# Altium schematic symbol library LATTICEPLDS_Library.SchLib: 291 symbols (part 3 of 32)
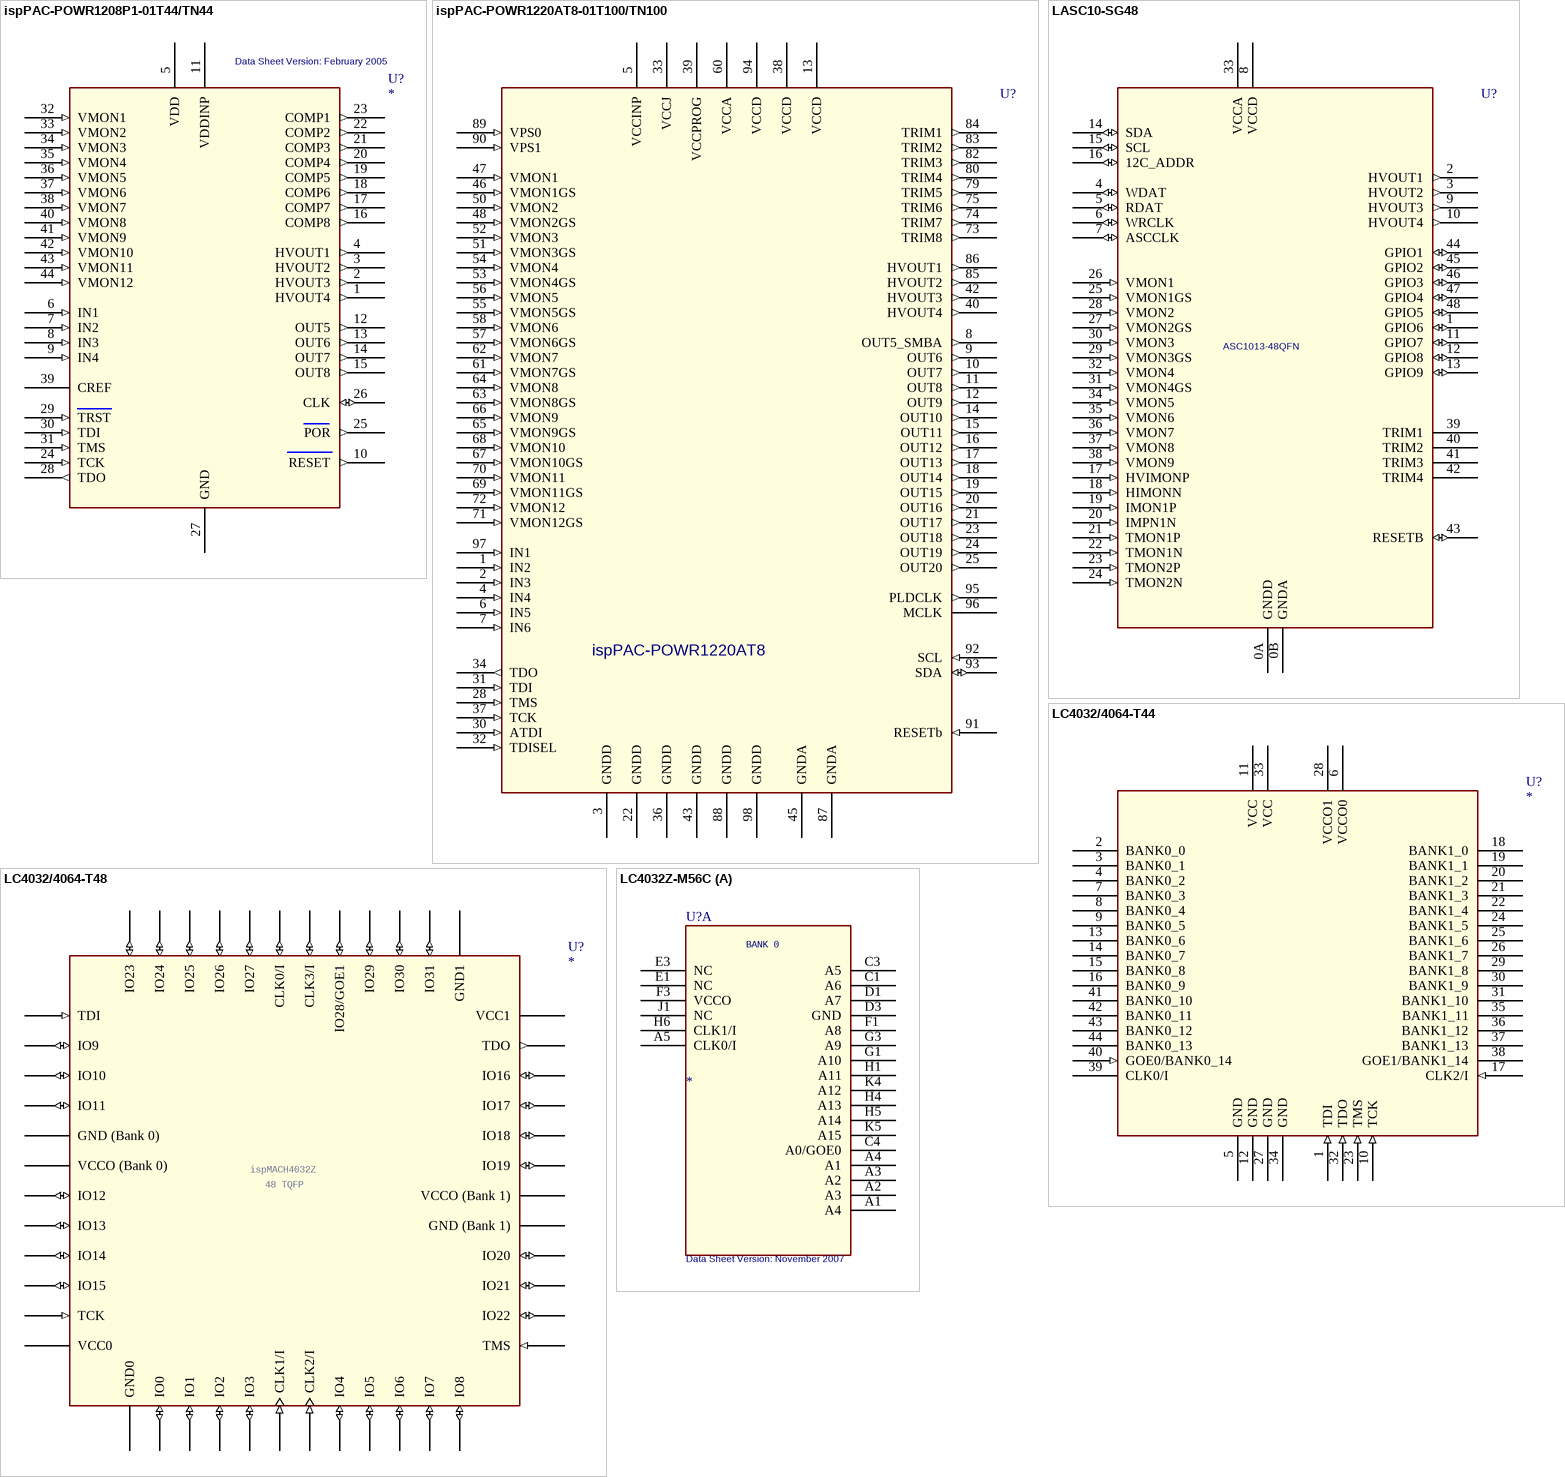
[diagram p305: symbols ispPAC-POWR1208P1-01T44/TN44 to LC4032Z-M56C]

## LASC10-SG48
designator U?, comment ASC1013-48QFN
pins: 0A GNDD (power), 0B GNDA (power), 1 GPIO6 (io), 2 HVOUT1 (out), 3 HVOUT2 (out), 4 WDAT (io), 5 RDAT (io), 6 WRCLK (io), 7 ASCCLK (io), 8 VCCD (power), 9 HVOUT3 (out), 10 HVOUT4 (out), 11 GPIO7 (io), 12 GPIO8 (io), 13 GPIO9 (io), 14 SDA (io), 15 SCL (io), 16 12C_ADDR (io), 17 HVIMONP (in), 18 HIMONN (in), 19 IMON1P (in), 20 IMPN1N (in), 21 TMON1P (in), 22 TMON1N (in), 23 TMON2P (in), 24 TMON2N (in), 25 VMON1GS (in), 26 VMON1 (in), 27 VMON2GS (in), 28 VMON2 (in), 29 VMON3GS (in), 30 VMON3 (in), 31 VMON4GS (in), 32 VMON4 (in), 33 VCCA (power), 34 VMON5 (in), 35 VMON6 (in), 36 VMON7 (in), 37 VMON8 (in), 38 VMON9 (in), 39 TRIM1, 40 TRIM2, 41 TRIM3, 42 TRIM4, 43 RESETB (io), 44 GPIO1 (io), 45 GPIO2 (io), 46 GPIO3 (io), 47 GPIO4 (io), 48 GPIO5 (io)

## LC4032/4064-T44
designator U?
pins: 1 TDI (in), 2 BANK0_0 (hiz), 3 BANK0_1 (hiz), 4 BANK0_2 (hiz), 5 GND (power), 6 VCCO0 (power), 7 BANK0_3 (hiz), 8 BANK0_4 (hiz), 9 BANK0_5 (hiz), 10 TCK (in), 11 VCC (power), 12 GND (power), 13 BANK0_6 (hiz), 14 BANK0_7 (hiz), 15 BANK0_8 (hiz), 16 BANK0_9 (hiz), 17 CLK2/I (in), 18 BANK1_0 (hiz), 19 BANK1_1 (hiz), 20 BANK1_2 (hiz), 21 BANK1_3 (hiz), 22 BANK1_4 (hiz), 23 TMS (in), 24 BANK1_5 (hiz), 25 BANK1_6 (hiz), 26 BANK1_7 (hiz), 27 GND (power), 28 VCCO1 (power), 29 BANK1_8 (hiz), 30 BANK1_9 (hiz), 31 BANK1_10 (hiz), 32 TDO (in), 33 VCC (power), 34 GND (power), 35 BANK1_11 (hiz), 36 BANK1_12 (hiz), 37 BANK1_13 (hiz), 38 GOE1/BANK1_14 (hiz), 39 CLK0/I (power), 40 GOE0/BANK0_14 (in), 41 BANK0_10 (hiz), 42 BANK0_11 (hiz), 43 BANK0_12 (hiz), 44 BANK0_13 (hiz)

## LC4032/4064-T48
designator U?
pins: CLK0/I (io), CLK1/I (in), CLK2/I (in), CLK3/I (io), GND0 (power), GND1 (power), GND (Bank 0) (power), GND (Bank 1) (power), IO0 (io), IO1 (io), IO2 (io), IO3 (io), IO4 (io), IO5 (io), IO6 (io), IO7 (io), IO8 (io), IO9 (io), IO10 (io), IO11 (io), IO12 (io), IO13 (io), IO14 (io), IO15 (io), IO16 (io), IO17 (io), IO18 (io), IO19 (io), IO20 (io), IO21 (io), IO22 (io), IO23 (io), IO24 (io), IO25 (io), IO26 (io), IO27 (io), IO28/GOE1 (io), IO29 (io), IO30 (io), IO31 (io), TCK (in), TDI (in), TDO (out), TMS (in), VCC0 (power), VCC1 (power), VCCO (Bank 0) (power), VCCO (Bank 1) (power)
text: ispMACH4032Z; 48 TQFP

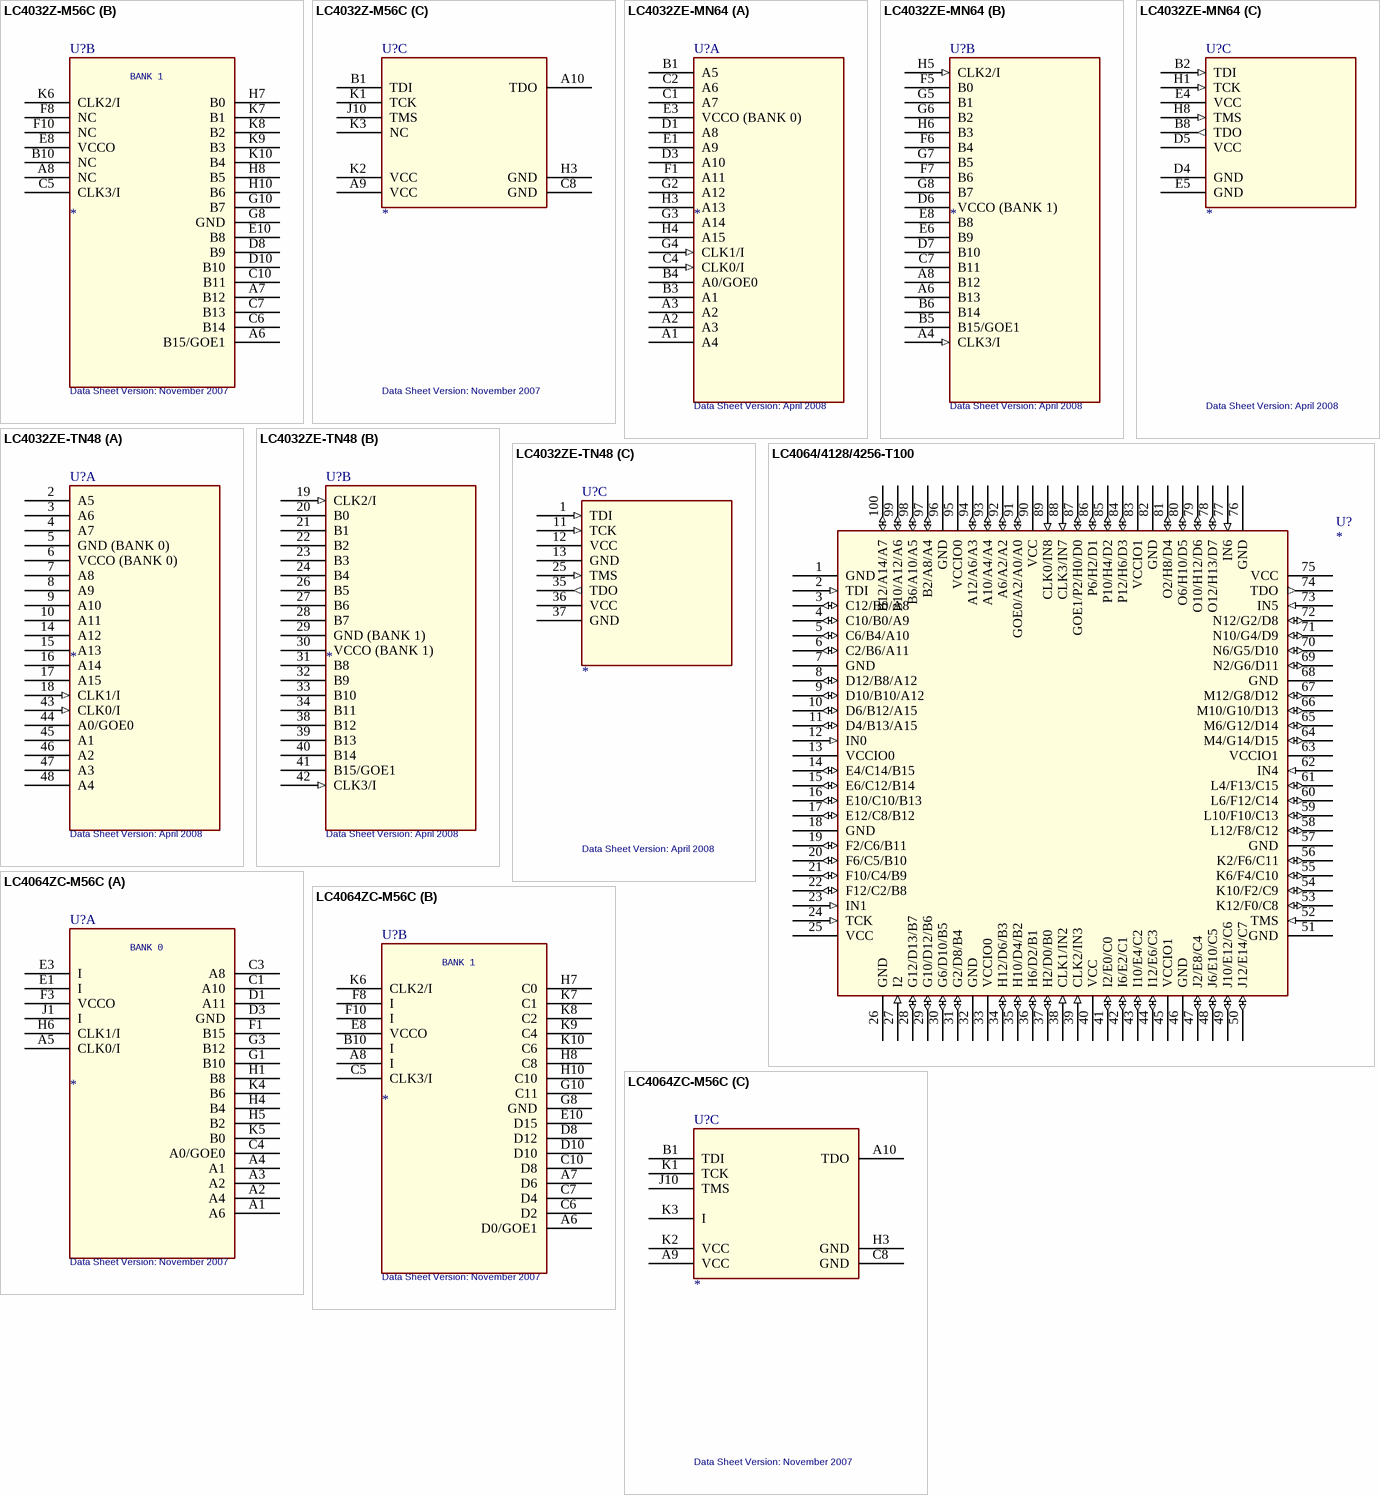
[diagram p23: symbols LC4032Z-M56C to LC4064ZC-M56C]

## LC4032Z-M56C
designator U?  Data Sheet Version: November 2007
SPLIT_INST: TRUE; SWAP_INFO: (S1+S2+S3)
part A pins: A1 A4, A2 A3, A3 A2, A4 A1, A5 CLK0/I, C1 A6 (power), C3 A5 (power), C4 A0/GOE0, D1 A7 (power), D3 GND (power), E1 NC (power), E3 NC (power), F1 A8 (power), F3 VCCO (power), G1 A10, G3 A9 (power), H1 A11, H4 A13, H5 A14, H6 CLK1/I, J1 NC, K4 A12, K5 A15
part B pins: A6 B15/GOE1, A7 B12, A8 NC, B10 NC, C5 CLK3/I, C6 B14, C7 B13, C10 B11, D8 B9, D10 B10, E8 VCCO, E10 B8, F8 NC, F10 NC, G8 GND, G10 B7, H7 B0, H8 B5, H10 B6, K6 CLK2/I, K7 B1, K8 B2, K9 B3, K10 B4
part C pins: A9 VCC, A10 TDO, B1 TDI (power), C8 GND, H3 GND, J10 TMS, K1 TCK, K2 VCC, K3 NC
part A text: BANK 0
part B text: BANK 1

## LC4032ZE-MN64
designator U?  Data Sheet Version: April 2008
SWAP_INFO: (S1+S2+S3); SPLIT_INST: TRUE
part A pins: A1 A4, A2 A3, A3 A2, B1 A5, B3 A1, B4 A0/GOE0, C1 A7, C2 A6, C4 CLK0/I (in), D1 A8, D3 A10, E1 A9, E3 VCCO (BANK 0) (power), F1 A11, G2 A12, G3 A14, G4 CLK1/I (in), H3 A13, H4 A15
part B pins: A4 CLK3/I (in), A6 B13, A8 B12, B5 B15/GOE1, B6 B14, C7 B11, D6 VCCO (BANK 1) (power), D7 B10, E6 B9, E8 B8, F5 B0, F6 B4, F7 B6, G5 B1, G6 B2, G7 B5, G8 B7, H5 CLK2/I (in), H6 B3
part C pins: B2 TDI (in), B8 TDO (out), D4 GND, D5 VCC (power), E4 VCC (power), E5 GND, H1 TCK (in), H8 TMS (in)

## LC4032ZE-TN48
designator U?  Data Sheet Version: April 2008
SWAP_INFO: (S1+S2+S3); SPLIT_INST: TRUE
part A pins: 2 A5, 3 A6, 4 A7, 5 GND (BANK 0) (power), 6 VCCO (BANK 0) (power), 7 A8, 8 A9, 9 A10, 10 A11, 14 A12, 15 A13, 16 A14, 17 A15, 18 CLK1/I (in), 43 CLK0/I (in), 44 A0/GOE0, 45 A1, 46 A2, 47 A3, 48 A4
part B pins: 19 CLK2/I (in), 20 B0, 21 B1, 22 B2, 23 B3, 24 B4, 26 B5, 27 B6, 28 B7, 29 GND (BANK 1) (power), 30 VCCO (BANK 1) (power), 31 B8, 32 B9, 33 B10, 34 B11, 38 B12, 39 B13, 40 B14, 41 B15/GOE1, 42 CLK3/I (in)
part C pins: 1 TDI (in), 11 TCK (in), 12 VCC (power), 13 GND (power), 25 TMS (in), 35 TDO (out), 36 VCC (power), 37 GND (power)

## LC4064/4128/4256-T100
designator U?
footprint TQFP-100
pins: 1 GND (power), 2 TDI (in), 3 C12/B0/A8 (io), 4 C10/B0/A9 (io), 5 C6/B4/A10 (io), 6 C2/B6/A11 (io), 7 GND (power), 8 D12/B8/A12 (io), 9 D10/B10/A12 (io), 10 D6/B12/A15 (io), 11 D4/B13/A15 (io), 12 IN0 (in), 13 VCCIO0 (power), 14 E4/C14/B15 (io), 15 E6/C12/B14 (io), 16 E10/C10/B13 (io), 17 E12/C8/B12 (io), 18 GND (power), 19 F2/C6/B11 (io), 20 F6/C5/B10 (io), 21 F10/C4/B9 (io), 22 F12/C2/B8 (io), 23 IN1 (in), 24 TCK (in), 25 VCC (power), 26 GND (power), 27 I2 (in), 28 G12/D13/B7 (io), 29 G10/D12/B6 (io), 30 G6/D10/B5 (io), 31 G2/D8/B4 (io), 32 GND (power), 33 VCCIO0 (power), 34 H12/D6/B3 (io), 35 H10/D4/B2 (io), 36 H6/D2/B1 (io), 37 H2/D0/B0 (io), 38 CLK1/IN2 (in), 39 CLK2/IN3 (in), 40 VCC (power), 41 I2/E0/C0 (io), 42 I6/E2/C1 (io), 43 I10/E4/C2 (io), 44 I12/E6/C3 (io), 45 VCCIO1 (power), 46 GND (power), 47 J2/E8/C4 (io), 48 J6/E10/C5 (io), 49 J10/E12/C6 (io), 50 J12/E14/C7 (io), 51 GND (power), 52 TMS (in), 53 K12/F0/C8 (io), 54 K10/F2/C9 (io), 55 K6/F4/C10 (io), 56 K2/F6/C11 (io), 57 GND (power), 58 L12/F8/C12 (io), 59 L10/F10/C13 (io), 60 L6/F12/C14 (io), 61 L4/F13/C15 (io), 62 IN4 (in), 63 VCCIO1 (power), 64 M4/G14/D15 (io), 65 M6/G12/D14 (io), 66 M10/G10/D13 (io), 67 M12/G8/D12 (io), 68 GND (power), 69 N2/G6/D11 (io), 70 N6/G5/D10 (io), 71 N10/G4/D9 (io), 72 N12/G2/D8 (io), 73 IN5 (in), 74 TDO (out), 75 VCC (power), 76 GND (power), 77 IN6 (in), 78 O12/H13/D7 (io), 79 O10/H12/D6 (io), 80 O6/H10/D5 (io), 81 O2/H8/D4 (io), 82 GND (power), 83 VCCIO1 (power), 84 P12/H6/D3 (io), 85 P10/H4/D2 (io), 86 P6/H2/D1 (io), 87 GOE1/P2/H0/D0 (io), 88 CLK3/IN7 (in), 89 CLK0/IN8 (in), 90 VCC (power), 91 GOE0/A2/A0/A0 (io), 92 A6/A2/A2 (io), 93 A10/A4/A4 (io), 94 A12/A6/A3 (io), 95 VCCIO0 (power), 96 GND (power), 97 B2/A8/A4 (io), 98 B6/A10/A5 (io), 99 B10/A12/A6 (io), 100 B12/A14/A7 (io)

## LC4064ZC-M56C
designator U?  Data Sheet Version: November 2007
SWAP_INFO: (S1+S2+S3); SPLIT_INST: TRUE
part A pins: A1 A6, A2 A4, A3 A2, A4 A1, A5 CLK0/I, C1 A10 (power), C3 A8 (power), C4 A0/GOE0, D1 A11 (power), D3 GND (power), E1 I (power), E3 I (power), F1 B15 (power), F3 VCCO (power), G1 B10, G3 B12 (power), H1 B8, H4 B4, H5 B2, H6 CLK1/I, J1 I, K4 B6, K5 B0
part B pins: A6 D0/GOE1, A7 D6, A8 I, B10 I, C5 CLK3/I, C6 D2, C7 D4, C10 D8, D8 D12, D10, E8 VCCO, E10 D15, F8 I, F10 I, G8 GND, G10 C11, H7 C0, H8 C8, H10 C10, K6 CLK2/I, K7 C1, K8 C2, K9 C4, K10 C6
part C pins: A9 VCC, A10 TDO, B1 TDI (power), C8 GND, H3 GND, J10 TMS, K1 TCK, K2 VCC, K3 I
part A text: BANK 0
part B text: BANK 1

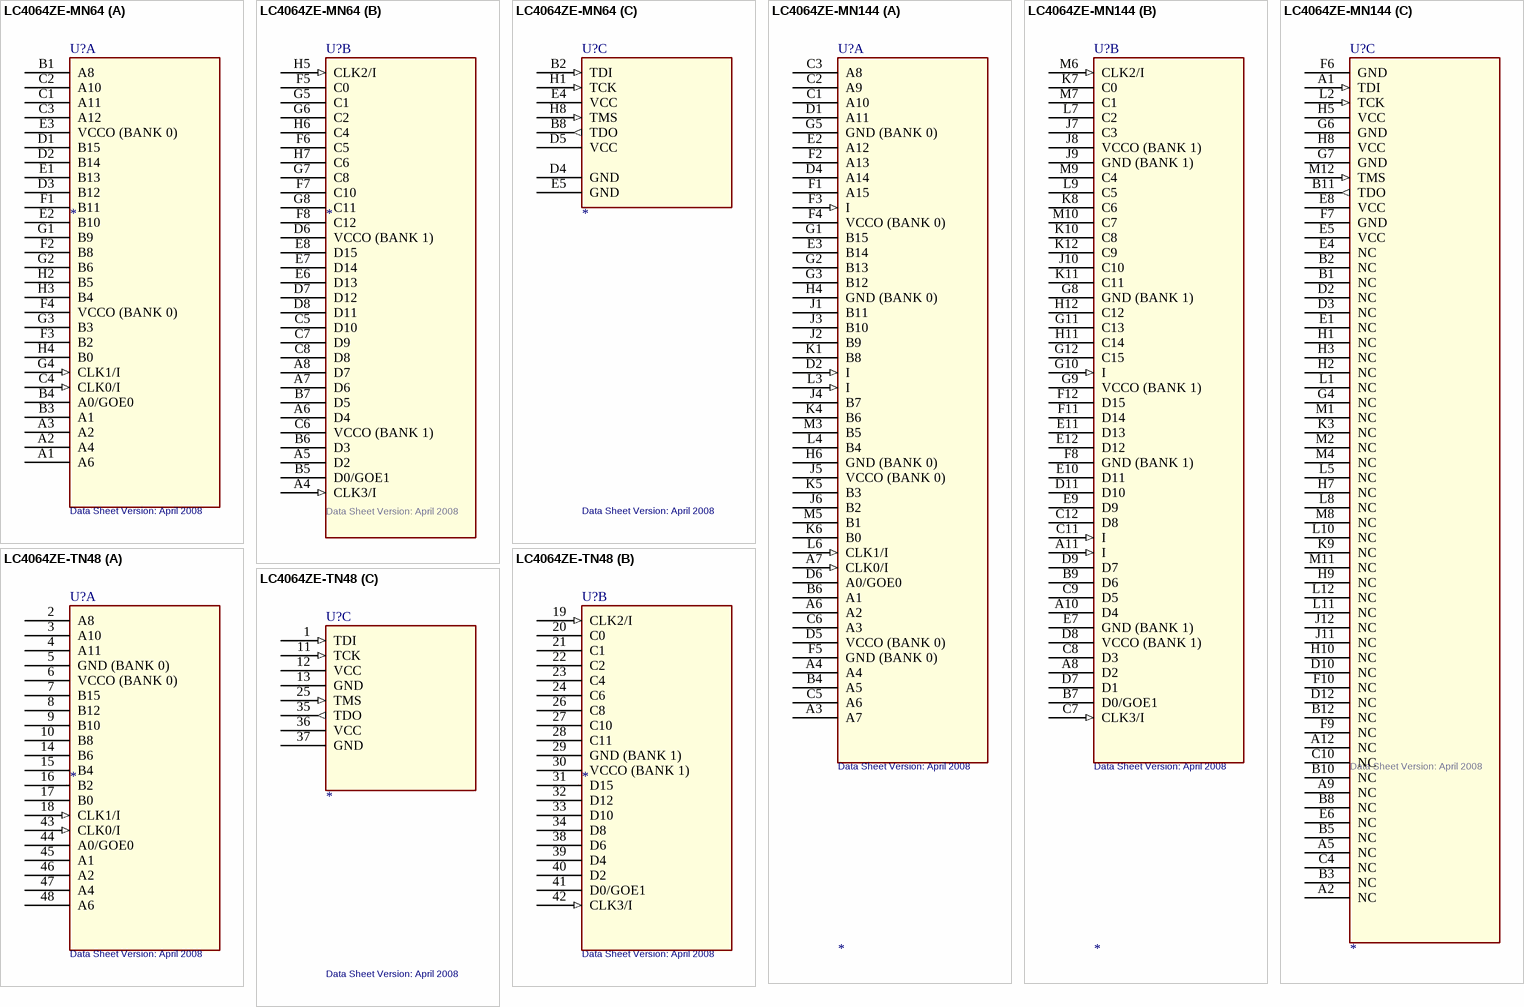
[diagram p24: symbols LC4064ZE-MN64 to LC4064ZE-TN48]

## LC4064ZE-MN64
designator U?  Data Sheet Version: April 2008
SPLIT_INST: TRUE; SWAP_INFO: (S1+S2+S3)
part A pins: A1 A6, A2 A4, A3 A2, B1 A8, B3 A1, B4 A0/GOE0, C1 A11, C2 A10, C3 A12, C4 CLK0/I (in), D1 B15, D2 B14, D3 B12, E1 B13, E2 B10, E3 VCCO (BANK 0) (power), F1 B11, F2 B8, F3 B2, F4 VCCO (BANK 0) (power), G1 B9, G2 B6, G3 B3, G4 CLK1/I (in), H2 B5, H3 B4, H4 B0
part B pins: A4 CLK3/I (in), A5 D2, A6 D4, A7 D6, A8 D7, B5 D0/GOE1, B6 D3, B7 D5, C5 D10, C6 VCCO (BANK 1) (power), C7 D9, C8 D8, D6 VCCO (BANK 1) (power), D7 D12, D8 D11, E6 D13, E7 D14, E8 D15, F5 C0, F6 C5, F7 C10, F8 C12, G5 C1, G6 C2, G7 C8, G8 C11, H5 CLK2/I (in), H6 C4, H7 C6
part C pins: B2 TDI (in), B8 TDO (out), D4 GND, D5 VCC (power), E4 VCC (power), E5 GND, H1 TCK (in), H8 TMS (in)

## LC4064ZE-MN144
designator U?  Data Sheet Version: April 2008
SWAP_INFO: (S1+S2+S3); SPLIT_INST: TRUE
part A pins: A3 A7, A4, A6 A2, A7 CLK0/I (in), B4 A5, B6 A1, C1 A10, C2 A9, C3 A8, C5 A6, C6 A3, D1 A11, D2 I (in), D4 A14, D5 VCCO (BANK 0) (power), D6 A0/GOE0, E2 A12, E3 B14, F1 A15, F2 A13, F3 I (in), F4 VCCO (BANK 0) (power), F5 GND (BANK 0) (power), G1 B15, G2 B13, G3 B12, G5 GND (BANK 0) (power), H4 GND (BANK 0) (power), H6 GND (BANK 0) (power), J1 B11, J2 B9, J3 B10, J4 B7, J5 VCCO (BANK 0) (power), J6 B2, K1 B8, K4 B6, K5 B3, K6 B0, L3 I (in), L4 B4, L6 CLK1/I (in), M3 B5, M5 B1
part B pins: A8 D2, A10 D4, A11 I (in), B7 D0/GOE1, B9 D6, C7 CLK3/I (in), C8 D3, C9 D5, C11 I (in), C12 D8, D7 D1, D8 VCCO (BANK 1) (power), D9 D7, D11 D10, E7 GND (BANK 1) (power), E9 D9, E10 D11, E11 D13, E12 D12, F8 GND (BANK 1) (power), F11 D14, F12 D15, G8 GND (BANK 1) (power), G9 VCCO (BANK 1) (power), G10 I (in), G11 C13, G12 C15, H11 C14, H12 C12, J7 C3, J8 VCCO (BANK 1) (power), J9 GND (BANK 1) (power), J10 C10, K7 C0, K8 C6, K10 C8, K11 C11, K12 C9, L7 C2, L9 C5, M6 CLK2/I (in), M7 C1, M9 C4, M10 C7
part C pins: A1 TDI (in), A2 NC, A5 NC, A9 NC, A12 NC, B1 NC, B2 NC, B3 NC, B5 NC, B8 NC, B10 NC, B11 TDO (out), B12 NC, C4 NC, C10 NC, D2 NC, D3 NC, D10 NC, D12 NC, E1 NC, E4 NC, E5 VCC (power), E6 NC, E8 VCC (power), F6 GND (power), F7 GND (power), F9 NC, F10 NC, G4 NC, G6 GND (power), G7 GND (power), H1 NC, H2 NC, H3 NC, H5 VCC (power), H7 NC, H8 VCC (power), H9 NC, H10 NC, J11 NC, J12 NC, K3 NC, K9 NC, L1 NC, L2 TCK (in), L5 NC, L8 NC, L10 NC, L11 NC, L12 NC, M1 NC, M2 NC, M4 NC, M8 NC, M11 NC, M12 TMS (in)

## LC4064ZE-TN48
designator U?  Data Sheet Version: April 2008
SWAP_INFO: (S1+S2+S3); SPLIT_INST: TRUE
part A pins: 2 A8, 3 A10, 4 A11, 5 GND (BANK 0) (power), 6 VCCO (BANK 0) (power), 7 B15, 8 B12, 9 B10, 10 B8, 14 B6, 15 B4, 16 B2, 17 B0, 18 CLK1/I (in), 43 CLK0/I (in), 44 A0/GOE0, 45 A1, 46 A2, 47 A4, 48 A6
part B pins: 19 CLK2/I (in), 20 C0, 21 C1, 22 C2, 23 C4, 24 C6, 26 C8, 27 C10, 28 C11, 29 GND (BANK 1) (power), 30 VCCO (BANK 1) (power), 31 D15, 32 D12, 33 D10, 34 D8, 38 D6, 39 D4, 40 D2, 41 D0/GOE1, 42 CLK3/I (in)
part C pins: 1 TDI (in), 11 TCK (in), 12 VCC (power), 13 GND (power), 25 TMS (in), 35 TDO (out), 36 VCC (power), 37 GND (power)

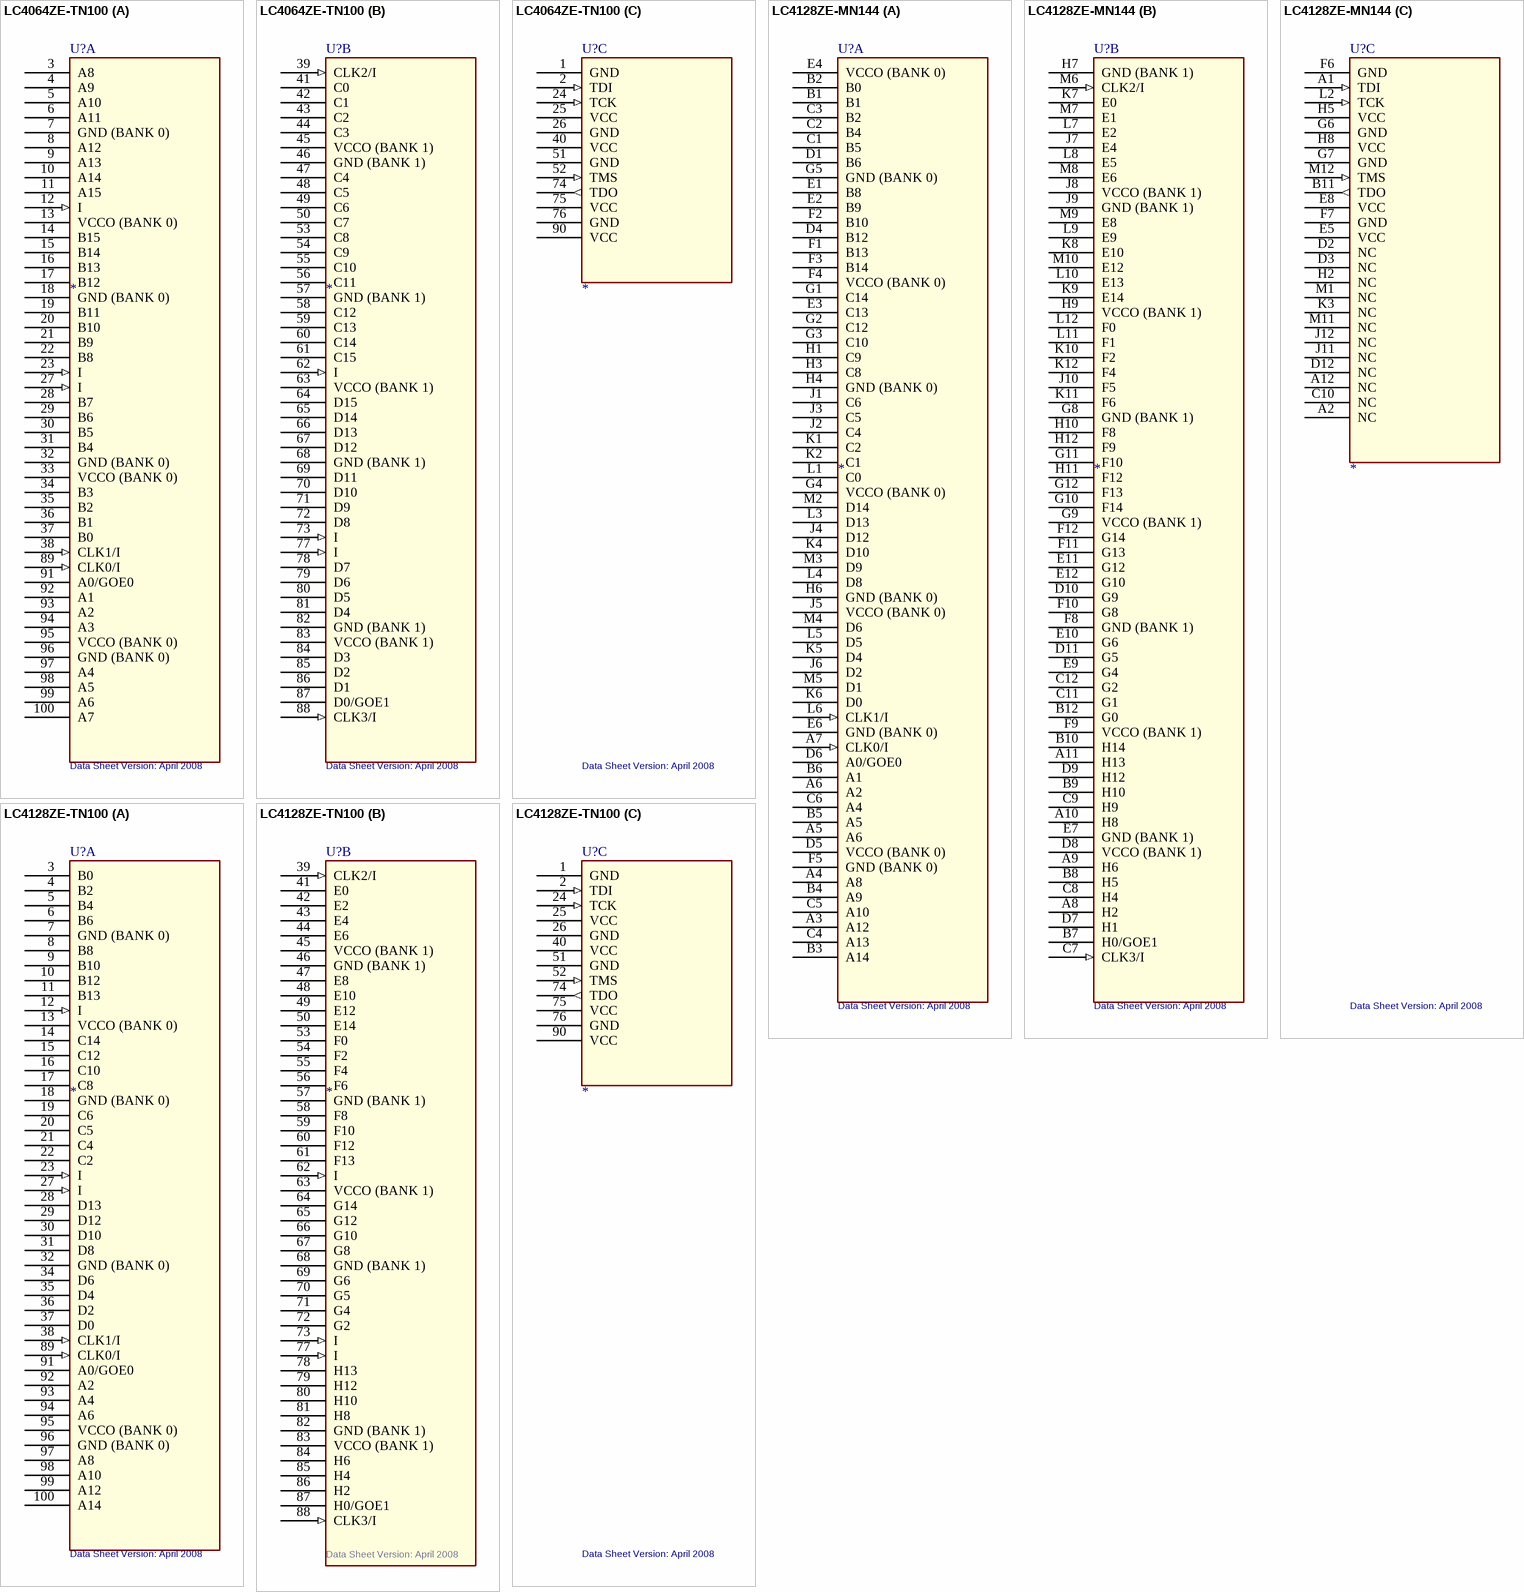
[diagram p25: symbols LC4064ZE-TN100 to LC4128ZE-TN100]

## LC4064ZE-TN100
designator U?  Data Sheet Version: April 2008
SWAP_INFO: (S1+S2+S3); SPLIT_INST: TRUE
part A pins: 3 A8, 4 A9, 5 A10, 6 A11, 7 GND (BANK 0) (power), 8 A12, 9 A13, 10 A14, 11 A15, 12 I (in), 13 VCCO (BANK 0) (power), 14 B15, 15 B14, 16 B13, 17 B12, 18 GND (BANK 0) (power), 19 B11, 20 B10, 21 B9, 22 B8, 23 I (in), 27 I (in), 28 B7, 29 B6, 30 B5, 31 B4, 32 GND (BANK 0) (power), 33 VCCO (BANK 0) (power), 34 B3, 35 B2, 36 B1, 37 B0, 38 CLK1/I (in), 89 CLK0/I (in), 91 A0/GOE0, 92 A1, 93 A2, 94 A3, 95 VCCO (BANK 0) (power), 96 GND (BANK 0) (power), 97 A4, 98 A5, 99 A6, 100 A7
part B pins: 39 CLK2/I (in), 41 C0, 42 C1, 43 C2, 44 C3, 45 VCCO (BANK 1) (power), 46 GND (BANK 1) (power), 47 C4, 48 C5, 49 C6, 50 C7, 53 C8, 54 C9, 55 C10, 56 C11, 57 GND (BANK 1) (power), 58 C12, 59 C13, 60 C14, 61 C15, 62 I (in), 63 VCCO (BANK 1) (power), 64 D15, 65 D14, 66 D13, 67 D12, 68 GND (BANK 1) (power), 69 D11, 70 D10, 71 D9, 72 D8, 73 I (in), 77 I (in), 78 D7, 79 D6, 80 D5, 81 D4, 82 GND (BANK 1) (power), 83 VCCO (BANK 1) (power), 84 D3, 85 D2, 86 D1, 87 D0/GOE1, 88 CLK3/I (in)
part C pins: 1 GND (power), 2 TDI (in), 24 TCK (in), 25 VCC (power), 26 GND (power), 40 VCC (power), 51 GND (power), 52 TMS (in), 74 TDO (out), 75 VCC (power), 76 GND (power), 90 VCC (power)

## LC4128ZE-MN144
designator U?  Data Sheet Version: April 2008
SWAP_INFO: (S1+S2+S3); SPLIT_INST: TRUE
part A pins: A3 A12, A4 A8, A5 A6, A6 A2, A7 CLK0/I (in), B1, B2 B0, B3 A14, B4 A9, B5 A5, B6 A1, C1 B5, C2 B4, C3 B2, C4 A13, C5 A10, C6 A4, D1 B6, D4 B12, D5 VCCO (BANK 0) (power), D6 A0/GOE0, E1 B8, E2 B9, E3 C13, E4 VCCO (BANK 0) (power), E6 GND (BANK 0) (power), F1 B13, F2 B10, F3 B14, F4 VCCO (BANK 0) (power), F5 GND (BANK 0) (power), G1 C14, G2 C12, G3 C10, G4 VCCO (BANK 0) (power), G5 GND (BANK 0) (power), H1 C9, H3 C8, H4 GND (BANK 0) (power), H6 GND (BANK 0) (power), J1 C6, J2 C4, J3 C5, J4 D12, J5 VCCO (BANK 0) (power), J6 D2, K1 C2, K2 C1, K4 D10, K5 D4, K6 D0, L1 C0, L3 D13, L4 D8, L5 D5, L6 CLK1/I (in), M2 D14, M3 D9, M4 D6, M5 D1
part B pins: A8 H2, A9 H6, A10 H8, A11 H13, B7 H0/GOE1, B8 H5, B9 H10, B10 H14, B12 G0, C7 CLK3/I (in), C8 H4, C9 H9, C11 G1, C12 G2, D7 H1, D8 VCCO (BANK 1) (power), D9 H12, D10 G9, D11 G5, E7 GND (BANK 1) (power), E9 G4, E10 G6, E11 G12, E12 G10, F8 GND (BANK 1) (power), F9 VCCO (BANK 1) (power), F10 G8, F11 G13, F12 G14, G8 GND (BANK 1) (power), G9 VCCO (BANK 1) (power), G10 F14, G11 F10, G12 F13, H7 GND (BANK 1) (power), H9 VCCO (BANK 1) (power), H10 F8, H11 F12, H12 F9, J7 E4, J8 VCCO (BANK 1) (power), J9 GND (BANK 1) (power), J10 F5, K7 E0, K8 E10, K9 E14, K10 F2, K11 F6, K12 F4, L7 E2, L8 E5, L9 E9, L10 E13, L11 F1, L12 F0, M6 CLK2/I (in), M7 E1, M8 E6, M9 E8, M10 E12
part C pins: A1 TDI (in), A2 NC, A12 NC, B11 TDO (out), C10 NC, D2 NC, D3 NC, D12 NC, E5 VCC (power), E8 VCC (power), F6 GND (power), F7 GND (power), G6 GND (power), G7 GND (power), H2 NC, H5 VCC (power), H8 VCC (power), J11 NC, J12 NC, K3 NC, L2 TCK (in), M1 NC, M11 NC, M12 TMS (in)

## LC4128ZE-TN100
designator U?  Data Sheet Version: April 2008
SWAP_INFO: (S1+S2+S3); SPLIT_INST: TRUE
part A pins: 3 B0, 4 B2, 5 B4, 6 B6, 7 GND (BANK 0) (power), 8 B8, 9 B10, 10 B12, 11 B13, 12 I (in), 13 VCCO (BANK 0) (power), 14 C14, 15 C12, 16 C10, 17 C8, 18 GND (BANK 0) (power), 19 C6, 20 C5, 21 C4, 22 C2, 23 I (in), 27 I (in), 28 D13, 29 D12, 30 D10, 31 D8, 32 GND (BANK 0) (power), 34 D6, 35 D4, 36 D2, 37 D0, 38 CLK1/I (in), 89 CLK0/I (in), 91 A0/GOE0, 92 A2, 93 A4, 94 A6, 95 VCCO (BANK 0) (power), 96 GND (BANK 0) (power), 97 A8, 98 A10, 99 A12, 100 A14
part B pins: 39 CLK2/I (in), 41 E0, 42 E2, 43 E4, 44 E6, 45 VCCO (BANK 1) (power), 46 GND (BANK 1) (power), 47 E8, 48 E10, 49 E12, 50 E14, 53 F0, 54 F2, 55 F4, 56 F6, 57 GND (BANK 1) (power), 58 F8, 59 F10, 60 F12, 61 F13, 62 I (in), 63 VCCO (BANK 1) (power), 64 G14, 65 G12, 66 G10, 67 G8, 68 GND (BANK 1) (power), 69 G6, 70 G5, 71 G4, 72 G2, 73 I (in), 77 I (in), 78 H13, 79 H12, 80 H10, 81 H8, 82 GND (BANK 1) (power), 83 VCCO (BANK 1) (power), 84 H6, 85 H4, 86 H2, 87 H0/GOE1, 88 CLK3/I (in)
part C pins: 1 GND (power), 2 TDI (in), 24 TCK (in), 25 VCC (power), 26 GND (power), 40 VCC (power), 51 GND (power), 52 TMS (in), 74 TDO (out), 75 VCC (power), 76 GND (power), 90 VCC (power)
